# Altium footprint library HDR254P.PcbLib: 91 footprints (part 6 of 6)
Each footprint in its own frame and in the unit in brackets; x right, y up, seen from the top. Pads: shape width x height; smd on the part's side, far side on the other; paste and mask are expansions set on the pad; w line width, h text height; cw(c..) or ccw(c..) is an arc to the next point about the centre after c.
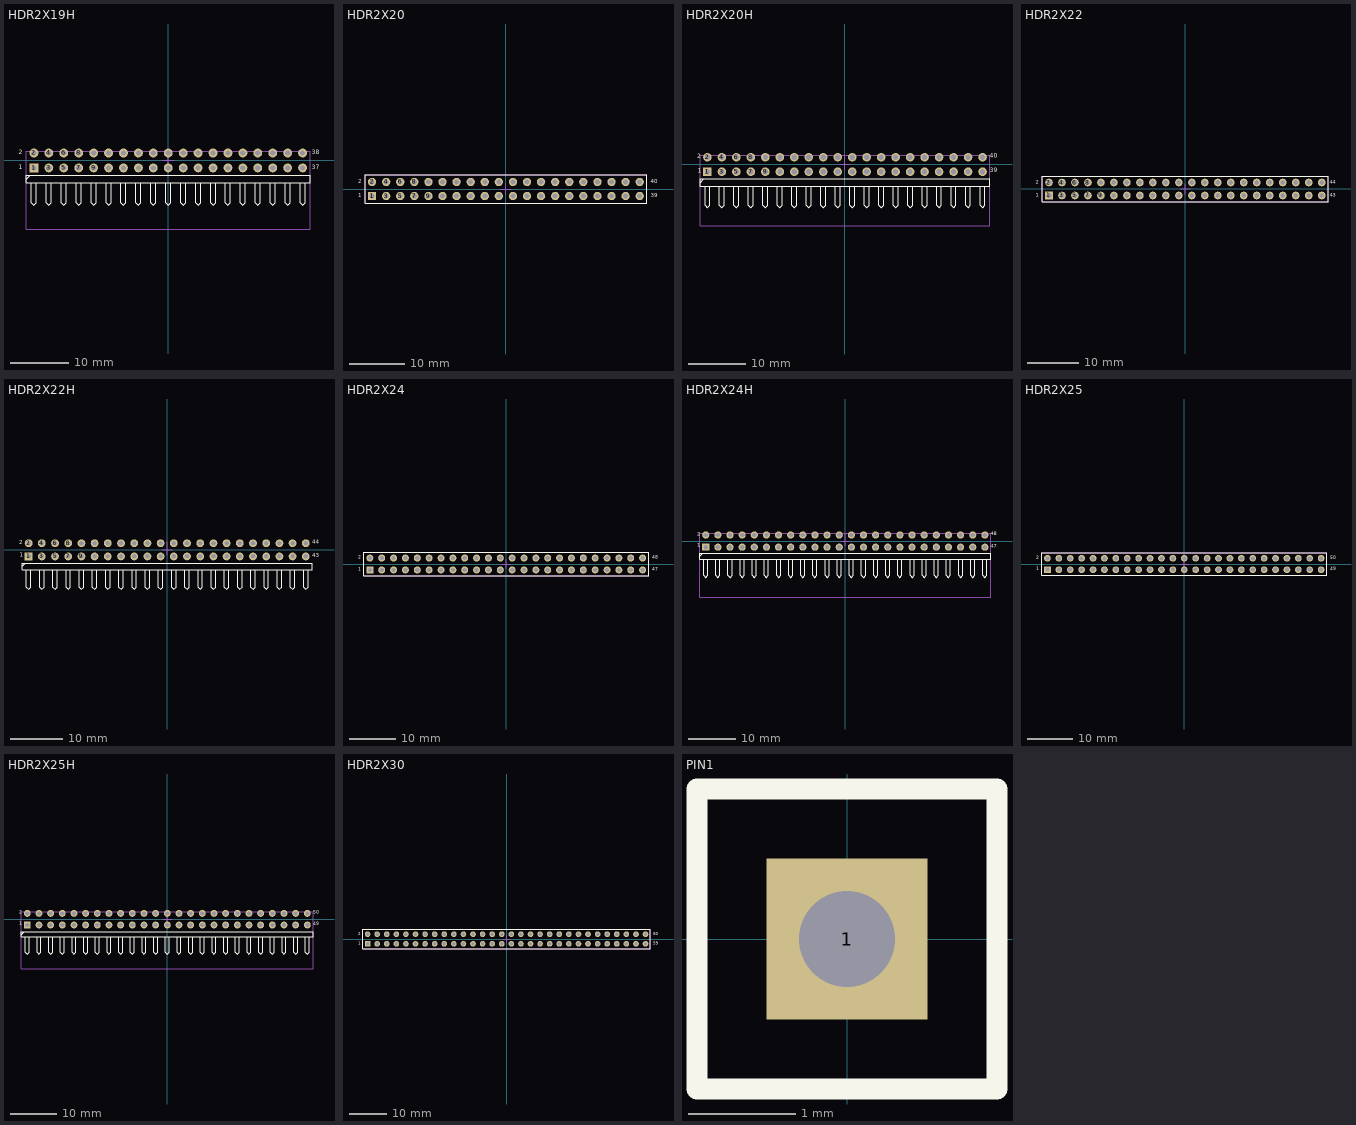
[diagram p5: the footprints below, top view; thin cyan lines are the x and y axes]

## HDR2X19H [mm] "Connector; Header; 19x2 Position; Right Angle"
pads (38):
  rect 1.5x1.5 hole 0.9: 1(-22.86,-1.27)
  round 1.5 hole 0.9: 2(-22.86,1.27) 3(-20.32,-1.27) 4(-20.32,1.27) 5(-17.78,-1.27) 6(-17.78,1.27) 7(-15.24,-1.27) 8(-15.24,1.27) 9(-12.7,-1.27) 10(-12.7,1.27) 11(-10.16,-1.27) 12(-10.16,1.27) 13(-7.62,-1.27) 14(-7.62,1.27) 15(-5.08,-1.27) 16(-5.08,1.27) 17(-2.54,-1.27) 18(-2.54,1.27) 19(0,-1.27) 20(0,1.27) 21(2.54,-1.27) 22(2.54,1.27) 23(5.08,-1.27) 24(5.08,1.27) 25(7.62,-1.27) 26(7.62,1.27) 27(10.16,-1.27) 28(10.16,1.27) 29(12.7,-1.27) 30(12.7,1.27) 31(15.24,-1.27) 32(15.24,1.27) 33(17.78,-1.27) 34(17.78,1.27) 35(20.32,-1.27) 36(20.32,1.27) 37(22.86,-1.27) 38(22.86,1.27)
Top Overlay:
  lines w0.2: -24.13,-3.175 -23.495,-2.54 ; -23.283,-3.81 -23.283,-7.197 -22.86,-7.62 -22.437,-7.197 -22.437,-3.81 ; -20.743,-3.81 -20.743,-7.197 -20.32,-7.62 -19.897,-7.197 -19.897,-3.81 ; -18.203,-3.81 -18.203,-7.197 -17.78,-7.62 -17.357,-7.197 -17.357,-3.81 ; -15.663,-3.81 -15.663,-7.197 -15.24,-7.62 -14.817,-7.197 -14.817,-3.81 ; -13.123,-3.81 -13.123,-7.197 -12.7,-7.62 -12.277,-7.197 -12.277,-3.81 ; -10.583,-3.81 -10.583,-7.197 -10.16,-7.62 -9.737,-7.197 -9.737,-3.81 ; -8.043,-3.81 -8.043,-7.197 -7.62,-7.62 -7.197,-7.197 -7.197,-3.81 ; -5.503,-3.81 -5.503,-7.197 -5.08,-7.62 -4.657,-7.197 -4.657,-3.81 ; -2.963,-3.81 -2.963,-7.197 -2.54,-7.62 -2.117,-7.197 -2.117,-3.81 ; -0.423,-3.81 -0.423,-7.197 0,-7.62 0.423,-7.197 0.423,-3.81 ; 2.117,-3.81 2.117,-7.197 2.54,-7.62 2.963,-7.197 2.963,-3.81 ; 4.657,-3.81 4.657,-7.197 5.08,-7.62 5.503,-7.197 5.503,-3.81 ; 7.197,-3.81 7.197,-7.197 7.62,-7.62 8.043,-7.197 8.043,-3.81 ; 9.737,-3.81 9.737,-7.197 10.16,-7.62 10.583,-7.197 10.583,-3.81 ; 12.277,-3.81 12.277,-7.197 12.7,-7.62 13.123,-7.197 13.123,-3.81 ; 14.817,-3.81 14.817,-7.197 15.24,-7.62 15.663,-7.197 15.663,-3.81 ; 17.357,-3.81 17.357,-7.197 17.78,-7.62 18.203,-7.197 18.203,-3.81 ; 19.897,-3.81 19.897,-7.197 20.32,-7.62 20.743,-7.197 20.743,-3.81 ; 22.437,-3.81 22.437,-7.197 22.86,-7.62 23.283,-7.197 23.283,-3.81 ; -24.13,-3.81 24.13,-3.81 24.13,-2.54 -24.13,-2.54 -24.13,-3.81
  text "38" at 24.384,0.762 h1.27
  text "37" at 24.384,-1.778 h1.27
  text "1" at -25.4,-1.778 h1.27
  text "2" at -25.4,0.762 h1.27
Mechanical 13:
  lines w0.1: -24.13,-11.747 24.13,-11.747 24.13,1.59 -24.13,1.59 -24.13,-11.747
Mechanical 15:
  lines w0.1: -1,0 1,0 ; 0,-1 0,1.59
3D body: height 5.11, standoff -2.95, extent -24.13,-11.747 24.13,1.59

## HDR2X20 [mm] "Connector; Header; 20x2 Position"
pads (40):
  rect 1.5x1.5 hole 0.9: 1(-24.13,-1.27)
  round 1.5 hole 0.9: 2(-24.13,1.27) 3(-21.59,-1.27) 4(-21.59,1.27) 5(-19.05,-1.27) 6(-19.05,1.27) 7(-16.51,-1.27) 8(-16.51,1.27) 9(-13.97,-1.27) 10(-13.97,1.27) 11(-11.43,-1.27) 12(-11.43,1.27) 13(-8.89,-1.27) 14(-8.89,1.27) 15(-6.35,-1.27) 16(-6.35,1.27) 17(-3.81,-1.27) 18(-3.81,1.27) 19(-1.27,-1.27) 20(-1.27,1.27) 21(1.27,-1.27) 22(1.27,1.27) 23(3.81,-1.27) 24(3.81,1.27) 25(6.35,-1.27) 26(6.35,1.27) 27(8.89,-1.27) 28(8.89,1.27) 29(11.43,-1.27) 30(11.43,1.27) 31(13.97,-1.27) 32(13.97,1.27) 33(16.51,-1.27) 34(16.51,1.27) 35(19.05,-1.27) 36(19.05,1.27) 37(21.59,-1.27) 38(21.59,1.27) 39(24.13,-1.27) 40(24.13,1.27)
Top Overlay:
  lines w0.2: -25.4,-2.54 25.4,-2.54 25.4,2.54 -25.4,2.54 -25.4,-2.54
  text "1" at -26.67,-1.778 h1.27
  text "2" at -26.67,0.762 h1.27
  text "40" at 26.162,0.762 h1.27
  text "39" at 26.162,-1.778 h1.27
Mechanical 13:
  lines w0.1: -25.4,-2.54 25.4,-2.54 25.4,2.54 -25.4,2.54 -25.4,-2.54
Mechanical 15:
  lines w0.1: -1,0 1,0 ; 0,-1 0,1
3D body: height 8.51, standoff -2.99, extent -25.4,-2.54 25.4,2.54

## HDR2X20H [mm] "Connector; Header; 20x2 Position; Right Angle"
pads (40):
  rect 1.5x1.5 hole 0.9: 1(-24.13,-1.27)
  round 1.5 hole 0.9: 2(-24.13,1.27) 3(-21.59,-1.27) 4(-21.59,1.27) 5(-19.05,-1.27) 6(-19.05,1.27) 7(-16.51,-1.27) 8(-16.51,1.27) 9(-13.97,-1.27) 10(-13.97,1.27) 11(-11.43,-1.27) 12(-11.43,1.27) 13(-8.89,-1.27) 14(-8.89,1.27) 15(-6.35,-1.27) 16(-6.35,1.27) 17(-3.81,-1.27) 18(-3.81,1.27) 19(-1.27,-1.27) 20(-1.27,1.27) 21(1.27,-1.27) 22(1.27,1.27) 23(3.81,-1.27) 24(3.81,1.27) 25(6.35,-1.27) 26(6.35,1.27) 27(8.89,-1.27) 28(8.89,1.27) 29(11.43,-1.27) 30(11.43,1.27) 31(13.97,-1.27) 32(13.97,1.27) 33(16.51,-1.27) 34(16.51,1.27) 35(19.05,-1.27) 36(19.05,1.27) 37(21.59,-1.27) 38(21.59,1.27) 39(24.13,-1.27) 40(24.13,1.27)
Top Overlay:
  lines w0.2: -25.4,-3.175 -24.765,-2.54 ; -24.553,-3.81 -24.553,-7.197 -24.13,-7.62 -23.707,-7.197 -23.707,-3.81 ; -22.013,-3.81 -22.013,-7.197 -21.59,-7.62 -21.167,-7.197 -21.167,-3.81 ; -19.473,-3.81 -19.473,-7.197 -19.05,-7.62 -18.627,-7.197 -18.627,-3.81 ; -16.933,-3.81 -16.933,-7.197 -16.51,-7.62 -16.087,-7.197 -16.087,-3.81 ; -14.393,-3.81 -14.393,-7.197 -13.97,-7.62 -13.547,-7.197 -13.547,-3.81 ; -11.853,-3.81 -11.853,-7.197 -11.43,-7.62 -11.007,-7.197 -11.007,-3.81 ; -9.313,-3.81 -9.313,-7.197 -8.89,-7.62 -8.467,-7.197 -8.467,-3.81 ; -6.773,-3.81 -6.773,-7.197 -6.35,-7.62 -5.927,-7.197 -5.927,-3.81 ; -4.233,-3.81 -4.233,-7.197 -3.81,-7.62 -3.387,-7.197 -3.387,-3.81 ; -1.693,-3.81 -1.693,-7.197 -1.27,-7.62 -0.847,-7.197 -0.847,-3.81 ; 0.847,-3.81 0.847,-7.197 1.27,-7.62 1.693,-7.197 1.693,-3.81 ; 3.387,-3.81 3.387,-7.197 3.81,-7.62 4.233,-7.197 4.233,-3.81 ; 5.927,-3.81 5.927,-7.197 6.35,-7.62 6.773,-7.197 6.773,-3.81 ; 8.467,-3.81 8.467,-7.197 8.89,-7.62 9.313,-7.197 9.313,-3.81 ; 11.007,-3.81 11.007,-7.197 11.43,-7.62 11.853,-7.197 11.853,-3.81 ; 13.547,-3.81 13.547,-7.197 13.97,-7.62 14.393,-7.197 14.393,-3.81 ; 16.087,-3.81 16.087,-7.197 16.51,-7.62 16.933,-7.197 16.933,-3.81 ; 18.627,-3.81 18.627,-7.197 19.05,-7.62 19.473,-7.197 19.473,-3.81 ; 21.167,-3.81 21.167,-7.197 21.59,-7.62 22.013,-7.197 22.013,-3.81 ; 23.707,-3.81 23.707,-7.197 24.13,-7.62 24.553,-7.197 24.553,-3.81 ; -25.4,-3.81 25.4,-3.81 25.4,-2.54 -25.4,-2.54 -25.4,-3.81
  text "2" at -25.959,0.813 h1.27
  text "1" at -25.832,-1.676 h1.27
  text "39" at 25.4,-1.651 h1.27
  text "40" at 25.4,0.889 h1.27
Mechanical 13:
  lines w0.1: -25.4,-10.767 -25.4,1.59 25.4,1.59 25.4,-10.767 -25.4,-10.767
Mechanical 15:
  lines w0.1: -1,0 1,0 ; 0,-1 0,1.59
3D body: height 5.11, standoff -2.95, extent -25.4,-10.767 25.4,1.59

## HDR2X22 [mm] "Connector; Header; 22x2 Position"
pads (44):
  rect 1.5x1.5 hole 0.9: 1(-26.67,-1.27)
  round 1.5 hole 0.9: 2(-26.67,1.27) 3(-24.13,-1.27) 4(-24.13,1.27) 5(-21.59,-1.27) 6(-21.59,1.27) 7(-19.05,-1.27) 8(-19.05,1.27) 9(-16.51,-1.27) 10(-16.51,1.27) 11(-13.97,-1.27) 12(-13.97,1.27) 13(-11.43,-1.27) 14(-11.43,1.27) 15(-8.89,-1.27) 16(-8.89,1.27) 17(-6.35,-1.27) 18(-6.35,1.27) 19(-3.81,-1.27) 20(-3.81,1.27) 21(-1.27,-1.27) 22(-1.27,1.27) 23(1.27,-1.27) 24(1.27,1.27) 25(3.81,-1.27) 26(3.81,1.27) 27(6.35,-1.27) 28(6.35,1.27) 29(8.89,-1.27) 30(8.89,1.27) 31(11.43,-1.27) 32(11.43,1.27) 33(13.97,-1.27) 34(13.97,1.27) 35(16.51,-1.27) 36(16.51,1.27) 37(19.05,-1.27) 38(19.05,1.27) 39(21.59,-1.27) 40(21.59,1.27) 41(24.13,-1.27) 42(24.13,1.27) 43(26.67,-1.27) 44(26.67,1.27)
Top Overlay:
  lines w0.2: -27.94,-2.54 27.94,-2.54 27.94,2.54 -27.94,2.54 -27.94,-2.54
  text "2" at -29.21,0.762 h1.27
  text "1" at -29.21,-1.778 h1.27
  text "44" at 28.194,0.762 h1.27
  text "43" at 28.194,-1.778 h1.27
Mechanical 13:
  lines w0.1: -27.94,-2.54 27.94,-2.54 27.94,2.54 -27.94,2.54 -27.94,-2.54
Mechanical 15:
  lines w0.1: -1,0 1,0 ; 0,-1 0,1
3D body: height 9.01, standoff -2.99, extent -27.94,-2.54 27.94,2.54

## HDR2X22H [mm] "Connector; Header; 22x2 Position; Right Angle"
pads (44):
  rect 1.5x1.5 hole 0.9: 1(-26.67,-1.27)
  round 1.5 hole 0.9: 2(-26.67,1.27) 3(-24.13,-1.27) 4(-24.13,1.27) 5(-21.59,-1.27) 6(-21.59,1.27) 7(-19.05,-1.27) 8(-19.05,1.27) 9(-16.51,-1.27) 10(-16.51,1.27) 11(-13.97,-1.27) 12(-13.97,1.27) 13(-11.43,-1.27) 14(-11.43,1.27) 15(-8.89,-1.27) 16(-8.89,1.27) 17(-6.35,-1.27) 18(-6.35,1.27) 19(-3.81,-1.27) 20(-3.81,1.27) 21(-1.27,-1.27) 22(-1.27,1.27) 23(1.27,-1.27) 24(1.27,1.27) 25(3.81,-1.27) 26(3.81,1.27) 27(6.35,-1.27) 28(6.35,1.27) 29(8.89,-1.27) 30(8.89,1.27) 31(11.43,-1.27) 32(11.43,1.27) 33(13.97,-1.27) 34(13.97,1.27) 35(16.51,-1.27) 36(16.51,1.27) 37(19.05,-1.27) 38(19.05,1.27) 39(21.59,-1.27) 40(21.59,1.27) 41(24.13,-1.27) 42(24.13,1.27) 43(26.67,-1.27) 44(26.67,1.27)
Top Overlay:
  lines w0.2: -27.94,-3.175 -27.305,-2.54 ; -27.093,-3.81 -27.093,-7.197 -26.67,-7.62 -26.247,-7.197 -26.247,-3.81 ; -24.553,-3.81 -24.553,-7.197 -24.13,-7.62 -23.707,-7.197 -23.707,-3.81 ; -22.013,-3.81 -22.013,-7.197 -21.59,-7.62 -21.167,-7.197 -21.167,-3.81 ; -19.473,-3.81 -19.473,-7.197 -19.05,-7.62 -18.627,-7.197 -18.627,-3.81 ; -16.933,-3.81 -16.933,-7.197 -16.51,-7.62 -16.087,-7.197 -16.087,-3.81 ; -14.393,-3.81 -14.393,-7.197 -13.97,-7.62 -13.547,-7.197 -13.547,-3.81 ; -11.853,-3.81 -11.853,-7.197 -11.43,-7.62 -11.007,-7.197 -11.007,-3.81 ; -9.313,-3.81 -9.313,-7.197 -8.89,-7.62 -8.467,-7.197 -8.467,-3.81 ; -6.773,-3.81 -6.773,-7.197 -6.35,-7.62 -5.927,-7.197 -5.927,-3.81 ; -4.233,-3.81 -4.233,-7.197 -3.81,-7.62 -3.387,-7.197 -3.387,-3.81 ; -1.693,-3.81 -1.693,-7.197 -1.27,-7.62 -0.847,-7.197 -0.847,-3.81 ; 0.847,-3.81 0.847,-7.197 1.27,-7.62 1.693,-7.197 1.693,-3.81 ; 3.387,-3.81 3.387,-7.197 3.81,-7.62 4.233,-7.197 4.233,-3.81 ; 5.927,-3.81 5.927,-7.197 6.35,-7.62 6.773,-7.197 6.773,-3.81 ; 8.467,-3.81 8.467,-7.197 8.89,-7.62 9.313,-7.197 9.313,-3.81 ; 11.007,-3.81 11.007,-7.197 11.43,-7.62 11.853,-7.197 11.853,-3.81 ; 13.547,-3.81 13.547,-7.197 13.97,-7.62 14.393,-7.197 14.393,-3.81 ; 16.087,-3.81 16.087,-7.197 16.51,-7.62 16.933,-7.197 16.933,-3.81 ; 18.627,-3.81 18.627,-7.197 19.05,-7.62 19.473,-7.197 19.473,-3.81 ; 21.167,-3.81 21.167,-7.197 21.59,-7.62 22.013,-7.197 22.013,-3.81 ; 23.707,-3.81 23.707,-7.197 24.13,-7.62 24.553,-7.197 24.553,-3.81 ; 26.247,-3.81 26.247,-7.197 26.67,-7.62 27.093,-7.197 27.093,-3.81 ; -27.94,-3.81 27.94,-3.81 27.94,-2.54 -27.94,-2.54 -27.94,-3.81
  text "44" at 27.94,0.889 h1.27
  text "43" at 27.94,-1.676 h1.27
  text "1" at -28.423,-1.651 h1.27
  text "2" at -28.524,0.813 h1.27
Mechanical 15:
  lines w0.1: -1,0 1,0 ; 0,-1 0,1.59
3D body: height 5.11, standoff -2.95, extent -27.94,-11.747 27.94,1.59

## HDR2X24 [mm] "Connector; Header; 24x2 Position"
pads (48):
  rect 1.5x1.5 hole 0.9: 1(-29.21,-1.27)
  round 1.5 hole 0.9: 2(-29.21,1.27) 3(-26.67,-1.27) 4(-26.67,1.27) 5(-24.13,-1.27) 6(-24.13,1.27) 7(-21.59,-1.27) 8(-21.59,1.27) 9(-19.05,-1.27) 10(-19.05,1.27) 11(-16.51,-1.27) 12(-16.51,1.27) 13(-13.97,-1.27) 14(-13.97,1.27) 15(-11.43,-1.27) 16(-11.43,1.27) 17(-8.89,-1.27) 18(-8.89,1.27) 19(-6.35,-1.27) 20(-6.35,1.27) 21(-3.81,-1.27) 22(-3.81,1.27) 23(-1.27,-1.27) 24(-1.27,1.27) 25(1.27,-1.27) 26(1.27,1.27) 27(3.81,-1.27) 28(3.81,1.27) 29(6.35,-1.27) 30(6.35,1.27) 31(8.89,-1.27) 32(8.89,1.27) 33(11.43,-1.27) 34(11.43,1.27) 35(13.97,-1.27) 36(13.97,1.27) 37(16.51,-1.27) 38(16.51,1.27) 39(19.05,-1.27) 40(19.05,1.27) 41(21.59,-1.27) 42(21.59,1.27) 43(24.13,-1.27) 44(24.13,1.27) 45(26.67,-1.27) 46(26.67,1.27) 47(29.21,-1.27) 48(29.21,1.27)
Top Overlay:
  lines w0.2: -30.48,-2.54 -30.48,2.54 30.48,2.54 30.48,-2.54 -30.48,-2.54
  text "47" at 31.242,-1.778 h1.27
  text "48" at 31.242,0.762 h1.27
  text "1" at -31.75,-1.778 h1.27
  text "2" at -31.75,0.762 h1.27
Mechanical 13:
  lines w0.1: -30.48,-2.54 -30.48,2.54 30.48,2.54 30.48,-2.54 -30.48,-2.54
Mechanical 15:
  lines w0.1: -1,0 1,0 ; 0,-1 0,1
3D body: height 9.01, standoff -2.99, extent -30.48,-2.54 30.48,2.54

## HDR2X24H [mm] "Connector; Header; 24x2 Position; Right Angle"
pads (48):
  rect 1.5x1.5 hole 0.9: 1(-29.21,-1.27)
  round 1.5 hole 0.9: 2(-29.21,1.27) 3(-26.67,-1.27) 4(-26.67,1.27) 5(-24.13,-1.27) 6(-24.13,1.27) 7(-21.59,-1.27) 8(-21.59,1.27) 9(-19.05,-1.27) 10(-19.05,1.27) 11(-16.51,-1.27) 12(-16.51,1.27) 13(-13.97,-1.27) 14(-13.97,1.27) 15(-11.43,-1.27) 16(-11.43,1.27) 17(-8.89,-1.27) 18(-8.89,1.27) 19(-6.35,-1.27) 20(-6.35,1.27) 21(-3.81,-1.27) 22(-3.81,1.27) 23(-1.27,-1.27) 24(-1.27,1.27) 25(1.27,-1.27) 26(1.27,1.27) 27(3.81,-1.27) 28(3.81,1.27) 29(6.35,-1.27) 30(6.35,1.27) 31(8.89,-1.27) 32(8.89,1.27) 33(11.43,-1.27) 34(11.43,1.27) 35(13.97,-1.27) 36(13.97,1.27) 37(16.51,-1.27) 38(16.51,1.27) 39(19.05,-1.27) 40(19.05,1.27) 41(21.59,-1.27) 42(21.59,1.27) 43(24.13,-1.27) 44(24.13,1.27) 45(26.67,-1.27) 46(26.67,1.27) 47(29.21,-1.27) 48(29.21,1.27)
Top Overlay:
  lines w0.2: -30.48,-3.175 -29.845,-2.54 ; -29.633,-3.81 -29.633,-7.197 -29.21,-7.62 -28.787,-7.197 -28.787,-3.81 ; -27.093,-3.81 -27.093,-7.197 -26.67,-7.62 -26.247,-7.197 -26.247,-3.81 ; -24.553,-3.81 -24.553,-7.197 -24.13,-7.62 -23.707,-7.197 -23.707,-3.81 ; -22.013,-3.81 -22.013,-7.197 -21.59,-7.62 -21.167,-7.197 -21.167,-3.81 ; -19.473,-3.81 -19.473,-7.197 -19.05,-7.62 -18.627,-7.197 -18.627,-3.81 ; -16.933,-3.81 -16.933,-7.197 -16.51,-7.62 -16.087,-7.197 -16.087,-3.81 ; -14.393,-3.81 -14.393,-7.197 -13.97,-7.62 -13.547,-7.197 -13.547,-3.81 ; -11.853,-3.81 -11.853,-7.197 -11.43,-7.62 -11.007,-7.197 -11.007,-3.81 ; -9.313,-3.81 -9.313,-7.197 -8.89,-7.62 -8.467,-7.197 -8.467,-3.81 ; -6.773,-3.81 -6.773,-7.197 -6.35,-7.62 -5.927,-7.197 -5.927,-3.81 ; -4.233,-3.81 -4.233,-7.197 -3.81,-7.62 -3.387,-7.197 -3.387,-3.81 ; -1.693,-3.81 -1.693,-7.197 -1.27,-7.62 -0.847,-7.197 -0.847,-3.81 ; 0.847,-3.81 0.847,-7.197 1.27,-7.62 1.693,-7.197 1.693,-3.81 ; 3.387,-3.81 3.387,-7.197 3.81,-7.62 4.233,-7.197 4.233,-3.81 ; 5.927,-3.81 5.927,-7.197 6.35,-7.62 6.773,-7.197 6.773,-3.81 ; 8.467,-3.81 8.467,-7.197 8.89,-7.62 9.313,-7.197 9.313,-3.81 ; 11.007,-3.81 11.007,-7.197 11.43,-7.62 11.853,-7.197 11.853,-3.81 ; 13.547,-3.81 13.547,-7.197 13.97,-7.62 14.393,-7.197 14.393,-3.81 ; 16.087,-3.81 16.087,-7.197 16.51,-7.62 16.933,-7.197 16.933,-3.81 ; 18.627,-3.81 18.627,-7.197 19.05,-7.62 19.473,-7.197 19.473,-3.81 ; 21.167,-3.81 21.167,-7.197 21.59,-7.62 22.013,-7.197 22.013,-3.81 ; 23.707,-3.81 23.707,-7.197 24.13,-7.62 24.553,-7.197 24.553,-3.81 ; 26.247,-3.81 26.247,-7.197 26.67,-7.62 27.093,-7.197 27.093,-3.81 ; 28.787,-3.81 28.787,-7.197 29.21,-7.62 29.633,-7.197 29.633,-3.81 ; -30.48,-3.81 -30.48,-2.54 30.48,-2.54 30.48,-3.81 -30.48,-3.81
  text "48" at 30.48,0.889 h1.27
  text "47" at 30.48,-1.676 h1.27
  text "1" at -30.937,-1.499 h1.27
  text "2" at -31.039,0.838 h1.27
Mechanical 13:
  lines w0.1: -30.48,-11.747 -30.48,1.59 30.48,1.59 30.48,-11.747 -30.48,-11.747
Mechanical 15:
  lines w0.1: -1,0 1,0 ; 0,-1 0,1.59
3D body: height 5.11, standoff -2.95, extent -30.48,-11.747 30.48,1.59

## HDR2X25 [mm] "Connector; Header; 25x2 Position"
pads (50):
  rect 1.5x1.5 hole 0.9: 1(-30.48,-1.27)
  round 1.5 hole 0.9: 2(-30.48,1.27) 3(-27.94,-1.27) 4(-27.94,1.27) 5(-25.4,-1.27) 6(-25.4,1.27) 7(-22.86,-1.27) 8(-22.86,1.27) 9(-20.32,-1.27) 10(-20.32,1.27) 11(-17.78,-1.27) 12(-17.78,1.27) 13(-15.24,-1.27) 14(-15.24,1.27) 15(-12.7,-1.27) 16(-12.7,1.27) 17(-10.16,-1.27) 18(-10.16,1.27) 19(-7.62,-1.27) 20(-7.62,1.27) 21(-5.08,-1.27) 22(-5.08,1.27) 23(-2.54,-1.27) 24(-2.54,1.27) 25(0,-1.27) 26(0,1.27) 27(2.54,-1.27) 28(2.54,1.27) 29(5.08,-1.27) 30(5.08,1.27) 31(7.62,-1.27) 32(7.62,1.27) 33(10.16,-1.27) 34(10.16,1.27) 35(12.7,-1.27) 36(12.7,1.27) 37(15.24,-1.27) 38(15.24,1.27) 39(17.78,-1.27) 40(17.78,1.27) 41(20.32,-1.27) 42(20.32,1.27) 43(22.86,-1.27) 44(22.86,1.27) 45(25.4,-1.27) 46(25.4,1.27) 47(27.94,-1.27) 48(27.94,1.27) 49(30.48,-1.27) 50(30.48,1.27)
Top Overlay:
  lines w0.2: -31.75,-2.54 31.75,-2.54 31.75,2.54 -31.75,2.54 -31.75,-2.54
  text "50" at 32.512,0.762 h1.27
  text "49" at 32.512,-1.778 h1.27
  text "1" at -33.02,-1.778 h1.27
  text "2" at -33.02,0.762 h1.27
Mechanical 13:
  lines w0.1: -31.75,-2.54 -31.75,2.54 31.75,2.54 31.75,-2.54 -31.75,-2.54
Mechanical 15:
  lines w0.1: -1,0 1,0 ; 0,-1 0,1
3D body: height 8.01, standoff -2.99, extent -31.75,-2.54 31.75,2.54

## HDR2X25H [mm] "Connector; Header; 25x2 Position; Right Angle"
pads (50):
  rect 1.5x1.5 hole 0.9: 1(-30.48,-1.27)
  round 1.5 hole 0.9: 2(-30.48,1.27) 3(-27.94,-1.27) 4(-27.94,1.27) 5(-25.4,-1.27) 6(-25.4,1.27) 7(-22.86,-1.27) 8(-22.86,1.27) 9(-20.32,-1.27) 10(-20.32,1.27) 11(-17.78,-1.27) 12(-17.78,1.27) 13(-15.24,-1.27) 14(-15.24,1.27) 15(-12.7,-1.27) 16(-12.7,1.27) 17(-10.16,-1.27) 18(-10.16,1.27) 19(-7.62,-1.27) 20(-7.62,1.27) 21(-5.08,-1.27) 22(-5.08,1.27) 23(-2.54,-1.27) 24(-2.54,1.27) 25(0,-1.27) 26(0,1.27) 27(2.54,-1.27) 28(2.54,1.27) 29(5.08,-1.27) 30(5.08,1.27) 31(7.62,-1.27) 32(7.62,1.27) 33(10.16,-1.27) 34(10.16,1.27) 35(12.7,-1.27) 36(12.7,1.27) 37(15.24,-1.27) 38(15.24,1.27) 39(17.78,-1.27) 40(17.78,1.27) 41(20.32,-1.27) 42(20.32,1.27) 43(22.86,-1.27) 44(22.86,1.27) 45(25.4,-1.27) 46(25.4,1.27) 47(27.94,-1.27) 48(27.94,1.27) 49(30.48,-1.27) 50(30.48,1.27)
Top Overlay:
  lines w0.2: -31.75,-3.387 -31.115,-2.752 ; -30.903,-3.81 -30.903,-7.197 -30.48,-7.62 -30.057,-7.197 -30.057,-3.81 ; -28.363,-3.81 -28.363,-7.197 -27.94,-7.62 -27.517,-7.197 -27.517,-3.81 ; -25.823,-3.81 -25.823,-7.197 -25.4,-7.62 -24.977,-7.197 -24.977,-3.81 ; -23.283,-3.81 -23.283,-7.197 -22.86,-7.62 -22.437,-7.197 -22.437,-3.81 ; -20.743,-3.81 -20.743,-7.197 -20.32,-7.62 -19.897,-7.197 -19.897,-3.81 ; -18.203,-3.81 -18.203,-7.197 -17.78,-7.62 -17.357,-7.197 -17.357,-3.81 ; -15.663,-3.81 -15.663,-7.197 -15.24,-7.62 -14.817,-7.197 -14.817,-3.81 ; -13.123,-3.81 -13.123,-7.197 -12.7,-7.62 -12.277,-7.197 -12.277,-3.81 ; -10.583,-3.81 -10.583,-7.197 -10.16,-7.62 -9.737,-7.197 -9.737,-3.81 ; -8.043,-3.81 -8.043,-7.197 -7.62,-7.62 -7.197,-7.197 -7.197,-3.81 ; -5.503,-3.81 -5.503,-7.197 -5.08,-7.62 -4.657,-7.197 -4.657,-3.81 ; -2.963,-3.81 -2.963,-7.197 -2.54,-7.62 -2.117,-7.197 -2.117,-3.81 ; -0.423,-3.81 -0.423,-7.197 0,-7.62 0.423,-7.197 0.423,-3.81 ; 2.117,-3.81 2.117,-7.197 2.54,-7.62 2.963,-7.197 2.963,-3.81 ; 4.657,-3.81 4.657,-7.197 5.08,-7.62 5.503,-7.197 5.503,-3.81 ; 7.197,-3.81 7.197,-7.197 7.62,-7.62 8.043,-7.197 8.043,-3.81 ; 9.737,-3.81 9.737,-7.197 10.16,-7.62 10.583,-7.197 10.583,-3.81 ; 12.277,-3.81 12.277,-7.197 12.7,-7.62 13.123,-7.197 13.123,-3.81 ; 14.817,-3.81 14.817,-7.197 15.24,-7.62 15.663,-7.197 15.663,-3.81 ; 17.357,-3.81 17.357,-7.197 17.78,-7.62 18.203,-7.197 18.203,-3.81 ; 19.897,-3.81 19.897,-7.197 20.32,-7.62 20.743,-7.197 20.743,-3.81 ; 22.437,-3.81 22.437,-7.197 22.86,-7.62 23.283,-7.197 23.283,-3.81 ; 24.977,-3.81 24.977,-7.197 25.4,-7.62 25.823,-7.197 25.823,-3.81 ; 27.517,-3.81 27.517,-7.197 27.94,-7.62 28.363,-7.197 28.363,-3.81 ; 30.057,-3.81 30.057,-7.197 30.48,-7.62 30.903,-7.197 30.903,-3.81 ; -31.75,-3.81 -31.75,-2.752 31.75,-2.752 31.75,-3.81 -31.75,-3.81
  text "2" at -32.283,0.864 h1.27
  text "1" at -32.207,-1.676 h1.27
  text "49" at 31.75,-1.676 h1.27
  text "50" at 31.75,0.838 h1.27
Mechanical 13:
  lines w0.1: -31.75,-10.767 -31.75,1.59 31.75,1.59 31.75,-10.767 -31.75,-10.767
Mechanical 15:
  lines w0.1: -1,0 1,0 ; 0,-1 0,1.59
3D body: height 5.11, standoff -2.95, extent -31.75,-10.767 31.75,1.59

## HDR2X30 [mm] "Connector; Header; 30x2 Position"
pads (60):
  rect 1.5x1.5 hole 0.9: 1(-36.83,-1.27)
  round 1.5 hole 0.9: 2(-36.83,1.27) 3(-34.29,-1.27) 4(-34.29,1.27) 5(-31.75,-1.27) 6(-31.75,1.27) 7(-29.21,-1.27) 8(-29.21,1.27) 9(-26.67,-1.27) 10(-26.67,1.27) 11(-24.13,-1.27) 12(-24.13,1.27) 13(-21.59,-1.27) 14(-21.59,1.27) 15(-19.05,-1.27) 16(-19.05,1.27) 17(-16.51,-1.27) 18(-16.51,1.27) 19(-13.97,-1.27) 20(-13.97,1.27) 21(-11.43,-1.27) 22(-11.43,1.27) 23(-8.89,-1.27) 24(-8.89,1.27) 25(-6.35,-1.27) 26(-6.35,1.27) 27(-3.81,-1.27) 28(-3.81,1.27) 29(-1.27,-1.27) 30(-1.27,1.27) 31(1.27,-1.27) 32(1.27,1.27) 33(3.81,-1.27) 34(3.81,1.27) 35(6.35,-1.27) 36(6.35,1.27) 37(8.89,-1.27) 38(8.89,1.27) 39(11.43,-1.27) 40(11.43,1.27) 41(13.97,-1.27) 42(13.97,1.27) 43(16.51,-1.27) 44(16.51,1.27) 45(19.05,-1.27) 46(19.05,1.27) 47(21.59,-1.27) 48(21.59,1.27) 49(24.13,-1.27) 50(24.13,1.27) 51(26.67,-1.27) 52(26.67,1.27) 53(29.21,-1.27) 54(29.21,1.27) 55(31.75,-1.27) 56(31.75,1.27) 57(34.29,-1.27) 58(34.29,1.27) 59(36.83,-1.27) 60(36.83,1.27)
Top Overlay:
  lines w0.2: -38.1,-2.54 38.1,-2.54 38.1,2.54 -38.1,2.54 -38.1,-2.54
  text "60" at 38.862,0.762 h1.27
  text "59" at 38.862,-1.778 h1.27
  text "1" at -39.37,-1.778 h1.27
  text "2" at -39.37,0.762 h1.27
Mechanical 13:
  lines w0.1: -38.1,-2.54 38.1,-2.54 38.1,2.54 -38.1,2.54 -38.1,-2.54
Mechanical 15:
  lines w0.1: -1,0 1,0 ; 0,-1 0,1
3D body: height 8.01, standoff -2.99, extent -38.1,-2.54 38.1,2.54

## PIN1 [mm] "Connector; Plug"
pads (1):
  rect 1.5x1.5 hole 0.9: 1(0,0)
Top Overlay:
  lines w0.2: -1.4,-1.4 1.4,-1.4 1.4,1.4 -1.4,1.4 -1.4,-1.4
Mechanical 15:
  lines w0.1: -0.5,0 0.5,0 ; 0,-0.5 0,0.5
3D body: height 9.05, standoff -2.95, extent -1.25,-1.267 1.25,1.273